# Altium footprint library LibreriasUniversalesMatuTorres.PcbLib: 48 footprints (part 1 of 3)
Each footprint in its own frame and in the unit in brackets; x right, y up, seen from the top. Pads: shape width x height; smd on the part's side, far side on the other; paste and mask are expansions set on the pad; w line width, h text height; cw(c..) or ccw(c..) is an arc to the next point about the centre after c.
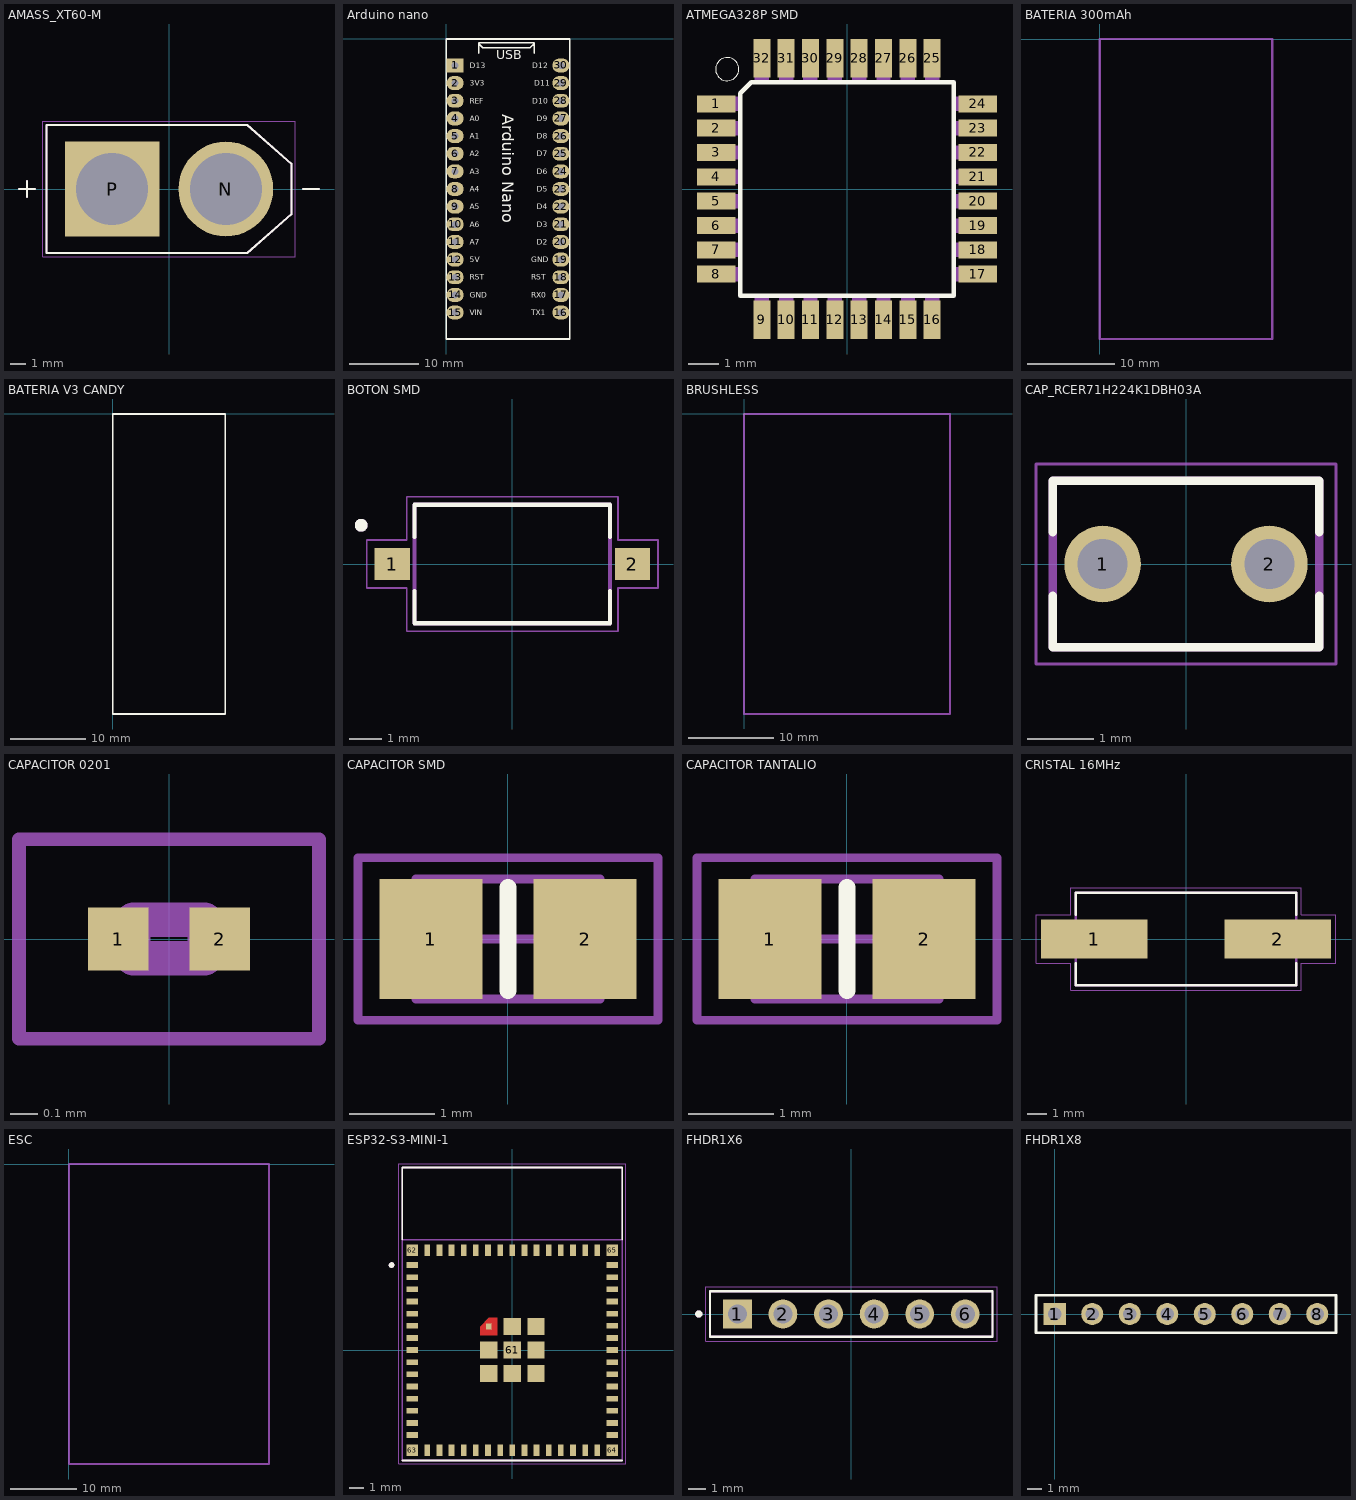
[diagram p0: the footprints below, top view; thin cyan lines are the x and y axes]

## AMASS_XT60-M [mm]
height 16
pads (2):
  round 6 hole 4.55: N(3.6,0)
  rect 6x6 / inner round 6 / far side rect 6x6 hole 4.55: P(-3.6,0)
Top Overlay:
  lines w0.127: -9.5,0 -8.5,0 ; -9,-0.5 -9,0.5 ; 8.5,0 9.5,0 ; -7.75,-4.05 4.95,-4.05 7.75,-1.6 7.75,1.6 4.95,4.05 -7.75,4.05 -7.75,-4.05
Mechanical 13:
  lines w0.127: -9.5,0 -8.5,0 ; -9,-0.5 -9,0.5 ; 8.5,0 9.5,0 ; -7.75,-4.05 4.95,-4.05 7.75,-1.6 7.75,1.6 4.95,4.05 -7.75,4.05 -7.75,-4.05
Mechanical 15:
  lines w0.05: -8,-4.3 -8,4.3 8,4.3 8,-4.3 -8,-4.3
3D body "step_temp.STEP": height 16, standoff -4.5, extent -7.75,-4.05 7.75,4.05

## Arduino nano [mm]
pads (30):
  rect 2.5x2 hole 1: 1(1.266,-3.813)
  oval 2.5x2 hole 1: 2(1.266,-6.353) 3(1.266,-8.893) 4(1.266,-11.433) 5(1.266,-13.973) 6(1.266,-16.513) 7(1.266,-19.053) 8(1.266,-21.593) 9(1.266,-24.133) 10(1.266,-26.673) 11(1.266,-29.213) 12(1.266,-31.753) 13(1.266,-34.293) 14(1.266,-36.833) 15(1.266,-39.373) 16(16.506,-39.373) 17(16.506,-36.833) 18(16.506,-34.293) 19(16.506,-31.753) 20(16.506,-29.213) 21(16.506,-26.673) 22(16.506,-24.133) 23(16.506,-21.593) 24(16.506,-19.053) 25(16.506,-16.513) 26(16.506,-13.973) 27(16.506,-11.433) 28(16.506,-8.893) 29(16.506,-6.353) 30(16.506,-3.813)
Top Overlay:
  lines w0.254: 4.666,-2.057 4.666,-0.554 12.666,-0.554 ; 4.686,-0.554 4.686,-0.674 5.276,-1.264 12.046,-1.264 12.636,-0.674 12.636,-0.574 ; 12.666,-2.057 12.666,-0.574 ; -0.004,-43.183 -0.004,-0.003 17.776,-0.003 17.776,-43.183 -0.004,-43.183
  text "Arduino Nano" at 8.041,-10.841 h1.7
  text "D11" at 12.64,-6.763 h0.8
  text "RST" at 3.416,-34.688 h0.8
  text "VIN" at 3.416,-39.788 h0.8
  text "GND" at 3.416,-37.238 h0.8
  text "D13" at 3.416,-4.213 h0.8
  text "REF" at 3.416,-9.288 h0.8
  text "D10" at 12.374,-9.288 h0.8
  text "D9" at 13.04,-11.838 h0.8
  text "D8" at 13.04,-14.388 h0.8
  text "D7" at 13.04,-16.913 h0.8
  text "D6" at 13.04,-19.463 h0.8
  text "D5" at 13.04,-21.988 h0.8
  text "D4" at 13.04,-24.538 h0.8
  text "D3" at 13.04,-27.088 h0.8
  text "D2" at 13.04,-29.613 h0.8
  text "GND" at 12.241,-32.163 h0.8
  text "RST" at 12.241,-34.688 h0.8
  text "TX1" at 12.241,-39.788 h0.8
  text "3V3" at 3.416,-6.763 h0.8
  text "A0" at 3.416,-11.838 h0.8
  text "A1" at 3.416,-14.388 h0.8
  text "A2" at 3.416,-16.913 h0.8
  text "A3" at 3.416,-19.463 h0.8
  text "A4" at 3.416,-21.988 h0.8
  text "A5" at 3.416,-24.538 h0.8
  text "A6" at 3.416,-27.088 h0.8
  text "A7" at 3.416,-29.613 h0.8
  text "5V" at 3.416,-32.163 h0.8
  text "USB" at 7.166,-2.938 h1.3
  text "D12" at 12.374,-4.213 h0.8
  text "RX0" at 12.241,-37.238 h0.8
3D body "Arduino_NANO_CH340.step": height 8.1, standoff -6.04, extent 0.001,-43.303 17.781,0.887

## ATMEGA328P SMD [mil]
pads (32):
  rect 50x22 smd: 1(-169,110.24) 2(-169,78.74) 3(-169,47.24) 4(-169,15.75) 5(-169,-15.75) 6(-169,-47.24) 7(-169,-78.74) 8(-169,-110.24) 17(169,-110.24) 18(169,-78.74) 19(169,-47.24) 20(169,-15.75) 21(169,15.75) 22(169,47.24) 23(169,78.74) 24(169,110.24)
  rect 22x50 smd: 9(-110.24,-169) 10(-78.74,-169) 11(-47.24,-169) 12(-15.75,-169) 13(15.75,-169) 14(47.24,-169) 15(78.74,-169) 16(110.24,-169) 25(110.24,169) 26(78.74,169) 27(47.24,169) 28(15.75,169) 29(-15.75,169) 30(-47.24,169) 31(-78.74,169) 32(-110.24,169)
Top Overlay:
  circle w0: c-155,155 r15
  lines w6: -137.99,-137.99 -137.99,124.02 -124.02,137.99 137.99,137.99 137.99,-137.99 -137.99,-137.99
Mechanical 13:
  region: -101.24,140.03 -119.26,140.03 -119.26,179 -101.24,179
  region: -69.74,140.04 -87.76,140.04 -87.76,179 -69.74,179
  region: -38.24,140.21 -56.33,140.21 -56.33,179 -38.24,179
  region: -6.75,140.18 -24.78,140.18 -24.78,179 -6.75,179
  region: 24.75,140.16 6.76,140.16 6.76,179 24.75,179
  region: 56.24,140.03 38.25,140.03 38.25,179 56.24,179
  region: 87.74,140.14 69.81,140.14 69.81,179 87.74,179
  region: 119.24,140.15 101.35,140.15 101.35,179 119.24,179
  region: 179,101.32 140.12,101.32 140.12,119.24 179,119.24
  region: 179,69.77 140.07,69.77 140.07,87.74 179,87.74
  region: 179,38.25 140.04,38.25 140.04,56.24 179,56.24
  region: 179,6.76 140.25,6.76 140.25,24.75 179,24.75
  region: 179,-24.77 140.1,-24.77 140.1,-6.75 179,-6.75
  region: 179,-56.28 140.1,-56.28 140.1,-38.24 179,-38.24
  region: 179,-87.85 140.17,-87.85 140.17,-69.74 179,-69.74
  region: 179,-119.34 140.12,-119.34 140.12,-101.24 179,-101.24
  region: 119.24,-179.16 101.33,-179.16 101.33,-140 119.24,-140
  region: 87.74,-179.3 69.86,-179.3 69.86,-140 87.74,-140
  region: 56.24,-179.17 38.28,-179.17 38.28,-140 56.24,-140
  region: 24.75,-179.27 6.76,-179.27 6.76,-140 24.75,-140
  region: -6.75,-179.09 -24.76,-179.09 -24.76,-140 -6.75,-140
  region: -38.24,-179.01 -56.25,-179.01 -56.25,-140 -38.24,-140
  region: -69.74,-179.12 -87.8,-179.12 -87.8,-140 -69.74,-140
  region: -101.24,-179 -119.24,-179 -119.24,-140 -101.24,-140
  region: -140,-119.37 -179.21,-119.37 -179.21,-101.24 -140,-101.24
  region: -140,-87.87 -179.27,-87.87 -179.27,-69.74 -140,-69.74
  region: -140,-56.27 -179.07,-56.27 -179.07,-38.24 -140,-38.24
  region: -140,-24.78 -179.25,-24.78 -179.25,-6.75 -140,-6.75
  region: -140,6.75 -179.16,6.75 -179.16,24.75 -140,24.75
  region: -140,38.24 -179,38.24 -179,56.24 -140,56.24
  region: -140,69.79 -179.14,69.79 -179.14,87.74 -140,87.74
  region: -140,101.33 -179.17,101.33 -179.17,119.24 -140,119.24
3D body "ATMEGA8A-AU.STEP": height 47.24, standoff 0, extent -177.16,-176.16 177.17,178.17

## BATERIA 300mAh [mm]
Mechanical 1:
  lines w0.254: 0,-34.4 19.8,-34.4 19.8,0 0,0 0,-34.4
3D body: height 17.76, standoff 0.25, extent 0,-34.4 19.8,0

## BATERIA V3 CANDY [mm]
Top Overlay:
  lines w0.254: 0,-40.02 0,-0.02 15,-0.02 15,-40.02 0,-40.02
3D body: height 17.76, standoff 0.25, extent 0,-39.98 15,-0.02

## BOTON SMD [mm]
height 2.5
pads (2):
  rect 1.1x1 smd: 1(-3.75,0) 2(3.75,0)
Top Overlay:
  circle w0.2: c-4.72,1.21 r0.1
  lines w0.127: -3.05,-0.85 -3.05,-1.85 3.05,-1.85 3.05,-0.85 ; -3.05,0.85 -3.05,1.85 3.05,1.85 3.05,0.85
Mechanical 13:
  circle w0.2: c-4.72,1.21 r0.1
  lines w0.127: -3.05,-1.85 3.05,-1.85 3.05,1.85 -3.05,1.85 -3.05,-1.85
Mechanical 15:
  lines w0.05: -4.55,-0.75 -4.55,0.75 -3.3,0.75 -3.3,2.1 3.3,2.1 3.3,0.75 4.55,0.75 4.55,-0.75 3.3,-0.75 3.3,-2.1 -3.3,-2.1 -3.3,-0.75 -4.55,-0.75
3D body "CUI_DEVICES_TS09-63-25-WT-160-SMT-TR.step": height 2.5, standoff -0.05, extent -3.909,-1.875 4.191,1.825

## BRUSHLESS [mm]
Mechanical 1:
  lines w0.254: 0,-35.02 0,-0.02 24,-0.02 24,-35.02 0,-35.02
3D body "AS2814 motor assembly.STEP": height 17.94, standoff -17.94, extent -6.531,-58.264 29.358,24.236

## CAP_RCER71H224K1DBH03A [mm]
pads (2):
  round 1.15 hole 0.75: 1(-1.25,0) 2(1.25,0)
Top Overlay:
  lines w0.127: -2,-0.476 -2,-1.25 2,-1.25 2,-0.476 ; -2,0.476 -2,1.25 2,1.25 2,0.476
Mechanical 13:
  lines w0.127: -2,-1.25 2,-1.25 2,1.25 -2,1.25 -2,-1.25
Mechanical 15:
  lines w0.05: -2.25,-1.5 2.25,-1.5 2.25,1.5 -2.25,1.5 -2.25,-1.5
3D body "RCER71H224K1DBH03A.STEP": height 23.5, standoff -5, extent -2,-1.25 2,1.25

## CAPACITOR 0201 [mm]
pads (2):
  rect 0.22x0.23 smd: 1(-0.185,0) 2(0.185,0)
Mechanical 13:
  lines w0.127: -0.13,-0.07 -0.13,0.07 0.13,0.07 0.13,-0.07 -0.13,-0.07
Mechanical 15:
  lines w0.05: -0.546,-0.363 -0.546,0.363 0.546,0.363 0.546,-0.363 -0.546,-0.363
3D body "GRM0115C1E101JE01L.STEP": height 0.14, standoff 0, extent -0.125,-0.062 0.125,0.062

## CAPACITOR SMD [mm] "0805"
pads (2):
  rect 1.2x1.4 smd: 1(-0.9,0) 2(0.9,0)
Top Overlay:
  lines w0.2: 0,-0.6 0,0.6
Mechanical 13:
  lines w0.1: -1.075,-0.7 1.075,-0.7 1.075,0.7 -1.075,0.7 -1.075,-0.7
Mechanical 15:
  lines w0.1: -0.5,0 0.5,0 ; 0,-0.5 0,0.5 ; -1.75,-0.95 1.75,-0.95 1.75,0.95 -1.75,0.95 -1.75,-0.95
3D body "GCM2195C1H103JA16D.STEP": height 1.22, standoff -0.03, extent -0.975,-0.739 1.025,0.711

## CAPACITOR TANTALIO [mm] "0805"
pads (2):
  rect 1.2x1.4 smd: 1(-0.9,0) 2(0.9,0)
Top Overlay:
  lines w0.2: 0,-0.6 0,0.6
Mechanical 13:
  lines w0.1: -1.075,-0.7 1.075,-0.7 1.075,0.7 -1.075,0.7 -1.075,-0.7
Mechanical 15:
  lines w0.1: -0.5,0 0.5,0 ; 0,-0.5 0,0.5 ; -1.75,-0.95 1.75,-0.95 1.75,0.95 -1.75,0.95 -1.75,-0.95
3D body "T494A106M010AT.STEP": height 1.8, standoff 0, extent -1.588,-0.788 1.612,0.812

## CRISTAL 16MHz [mm]
pads (2):
  rect 5.5x2 smd: 1(-4.75,0) 2(4.75,0)
Top Overlay:
  lines w0.127: -5.7,-1.254 -5.7,-2.4 5.7,-2.4 5.7,-1.254 ; -5.7,1.254 -5.7,2.4 5.7,2.4 5.7,1.254
Mechanical 13:
  lines w0.127: -5.7,-2.4 -5.7,2.4 5.7,2.4 5.7,-2.4 -5.7,-2.4
Mechanical 15:
  lines w0.05: -7.75,-1.25 -5.95,-1.25 -5.95,-2.65 5.95,-2.65 5.95,-1.25 7.75,-1.25 7.75,1.25 5.95,1.25 5.95,2.65 -5.95,2.65 -5.95,1.25 -7.75,1.25 -7.75,-1.25
3D body "ECS-160-18-5PX-TR.STEP": height 4.3, standoff 0, extent -6.6,-2.39 6.6,2.41

## ESC [mm]
Mechanical 1:
  lines w0.254: 0,-45 30,-45 30,0 0,0 0,-45

## ESP32-S3-MINI-1 [mm]
height 2.55
pads (73):
  rect 0.8x0.4 smd: 1(-7,5.95) 2(-7,5.1) 3(-7,4.25) 4(-7,3.4) 5(-7,2.55) 6(-7,1.7) 7(-7,0.85) 8(-7,0) 9(-7,-0.85) 10(-7,-1.7) 11(-7,-2.55) 12(-7,-3.4) 13(-7,-4.25) 14(-7,-5.1) 15(-7,-5.95) 31(7,-5.95) 32(7,-5.1) 33(7,-4.25) 34(7,-3.4) 35(7,-2.55) 36(7,-1.7) 37(7,-0.85) 38(7,0) 39(7,0.85) 40(7,1.7) 41(7,2.55) 42(7,3.4) 43(7,4.25) 44(7,5.1) 45(7,5.95)
  rect 0.4x0.8 smd: 16(-5.95,-7) 17(-5.1,-7) 18(-4.25,-7) 19(-3.4,-7) 20(-2.55,-7) 21(-1.7,-7) 22(-0.85,-7) 23(0,-7) 24(0.85,-7) 25(1.7,-7) 26(2.55,-7) 27(3.4,-7) 28(4.25,-7) 29(5.1,-7) 30(5.95,-7) 46(5.95,7) 47(5.1,7) 48(4.25,7) 49(3.4,7) 50(2.55,7) 51(1.7,7) 52(0.85,7) 53(0,7) 54(-0.85,7) 55(-1.7,7) 56(-2.55,7) 57(-3.4,7) 58(-4.25,7) 59(-5.1,7) 60(-5.95,7)
  rect 1.2x1.2 smd: 61(0,0) 61_2(0,1.65) 61_3(1.65,1.65) 61_4(1.65,0) 61_5(1.65,-1.65) 61_6(0,-1.65) 61_7(-1.65,-1.65) 61_8(-1.65,0)
  rect 0.4x0.4 smd paste-1 mask+0: 61_1(-1.65,1.65)
  rect 0.8x0.8 smd: 62(-7,7) 63(-7,-7) 64(7,-7) 65(7,7)
Top Layer:
  region: -1.05,1.05 -2.25,1.05 -2.25,1.65 -1.65,2.25 -1.05,2.25
Top Overlay:
  circle w0.2: c-8.45,5.95 r0.1
  lines w0.127: -7.7,-7.725 7.7,-7.725 ; -7.7,7.725 -7.7,12.775 7.7,12.775 7.7,7.725
Top Paste:
  region: -1.05,1.05 -2.25,1.05 -2.25,1.65 -1.65,2.25 -1.05,2.25
Top Solder:
  region: -0.95,0.95 -2.35,0.95 -2.35,1.7 -1.7,2.35 -0.95,2.35
Mechanical 13:
  circle w0.2: c-8.45,5.95 r0.1
  lines w0.127: -7.7,7.725 7.7,7.725 ; -7.7,7.725 -7.7,12.775 7.7,12.775 7.7,7.725 ; -7.7,7.725 -7.7,-7.725 7.7,-7.725 7.7,7.725
Mechanical 15:
  lines w0.05: -7.95,-7.975 7.95,-7.975 7.95,13.025 -7.95,13.025 -7.95,-7.975
3D body "step_temp.STEP": height 2.55, standoff 0, extent -7.7,-7.725 7.7,12.775

## FHDR1X6 [mm]
height 8.5
pads (6):
  rect 1.605x1.605 / inner round 1.605 / far side rect 1.605x1.605 hole 1.07: 1(-6.35,0)
  round 1.605 hole 1.07: 2(-3.81,0) 3(-1.27,0) 4(1.27,0) 5(3.81,0) 6(6.35,0)
Top Overlay:
  circle w0.2: c-8.5,0 r0.1
  lines w0.127: -7.87,-1.27 7.87,-1.27 7.87,1.27 -7.87,1.27 -7.87,-1.27
Mechanical 13:
  circle w0.2: c-8.5,0 r0.1
  lines w0.127: -7.87,-1.27 7.87,-1.27 7.87,1.27 -7.87,1.27 -7.87,-1.27
Mechanical 15:
  lines w0.05: -8.12,-1.52 8.12,-1.52 8.12,1.52 -8.12,1.52 -8.12,-1.52
3D body "step_temp.STEP": height 8.51, standoff -3.2, extent -7.874,-1.27 7.874,1.27

## FHDR1X8 [mm] "Connector; Header; 8 Position"
pads (8):
  rect 1.5x1.5 hole 0.9: 1(0,0)
  round 1.5 hole 0.9: 2(2.54,0) 3(5.08,0) 4(7.62,0) 5(10.16,0) 6(12.7,0) 7(15.24,0) 8(17.78,0)
Top Overlay:
  lines w0.2: -1.27,-1.27 -1.27,1.27 19.05,1.27 19.05,-1.27 -1.27,-1.27
3D body "8Fx1-254mm--3DModel-STEP-56544.STEP": height 8.65, standoff -3.4, extent -1.393,-1.225 19.177,1.275